# Altium schematic symbol library Блоки трансформаторов импульсных.SCHLIB: 325 symbols (part 1 of 2)
Pins are listed as number, name and electrical type; pins without a type are passive.

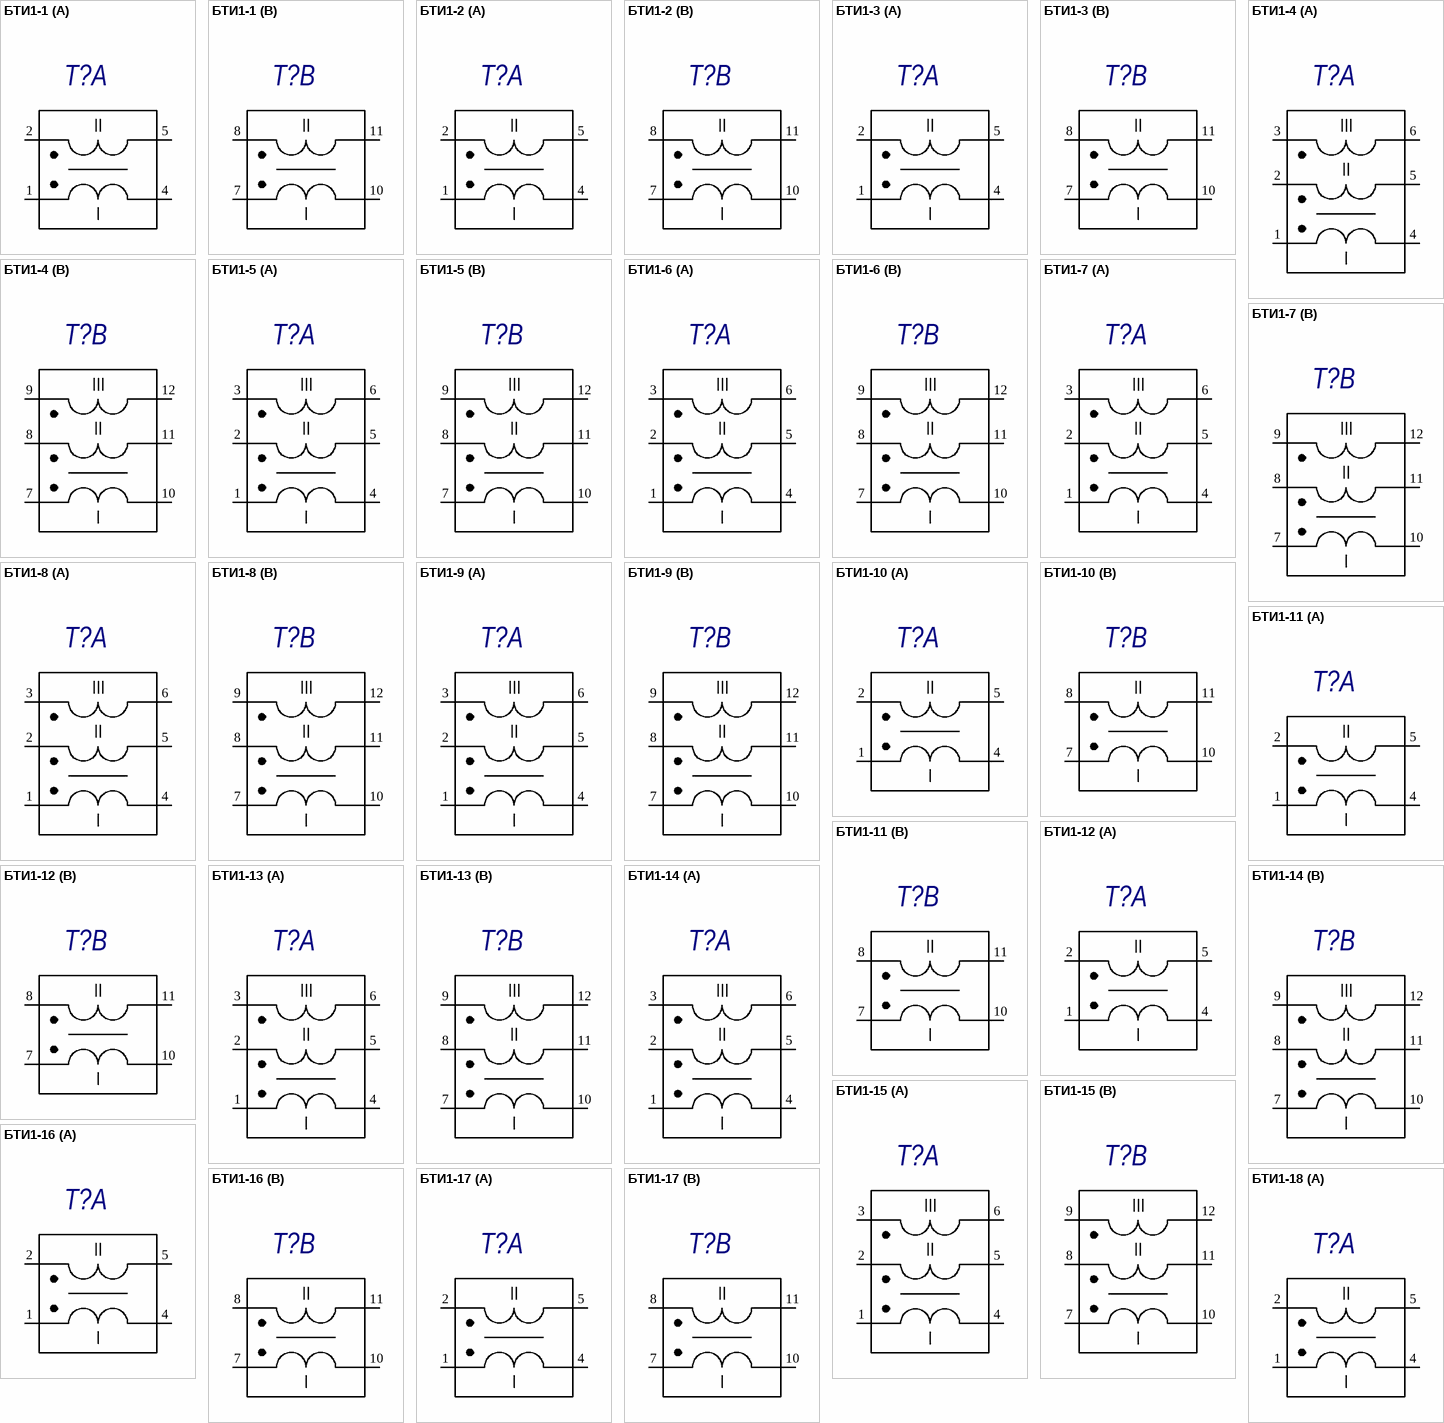
[diagram p0: symbols БТИ1-1 to БТИ1-18]

## БТИ1-1
designator T?
БТИ1; Manufacturer: ПАО  «МСТАТОР»; ManufacturerCountry: Россия; Value: {Value}; Наименование элемента: Дроссель; Category: Трансформатор; ComponentLink1Description: Manufacturer Link
footprint БТИ1
part A pins: 1, 2, 4, 5
part B pins: 7, 8, 10, 11
part A text: II; I
part B text: II; I

## БТИ1-2
designator T?
БТИ1; Manufacturer: ПАО  «МСТАТОР»; ManufacturerCountry: Россия; Value: {Value}; Наименование элемента: Дроссель; Category: Трансформатор; ComponentLink1Description: Manufacturer Link
footprint БТИ1
part A pins: 1, 2, 4, 5
part B pins: 7, 8, 10, 11
part A text: II; I
part B text: II; I

## БТИ1-3
designator T?
БТИ1; Manufacturer: ПАО  «МСТАТОР»; ManufacturerCountry: Россия; Value: {Value}; Наименование элемента: Дроссель; Category: Трансформатор; ComponentLink1Description: Manufacturer Link
footprint БТИ1
part A pins: 1, 2, 4, 5
part B pins: 7, 8, 10, 11
part A text: II; I
part B text: II; I

## БТИ1-4
designator T?
БТИ1; Manufacturer: ПАО  «МСТАТОР»; ManufacturerCountry: Россия; Value: {Value}; Наименование элемента: Дроссель; Category: Трансформатор; ComponentLink1Description: Manufacturer Link
footprint БТИ1
part A pins: 1, 2, 3, 4, 5, 6
part B pins: 7, 8, 9, 10, 11, 12
part A text: III; II; I
part B text: III; II; I

## БТИ1-5
designator T?
БТИ1; Manufacturer: ПАО  «МСТАТОР»; ManufacturerCountry: Россия; Value: {Value}; Наименование элемента: Дроссель; Category: Трансформатор; ComponentLink1Description: Manufacturer Link
footprint БТИ1
part A pins: 1, 2, 3, 4, 5, 6
part B pins: 7, 8, 9, 10, 11, 12
part A text: III; II; I
part B text: III; II; I

## БТИ1-6
designator T?
БТИ1; Manufacturer: ПАО  «МСТАТОР»; ManufacturerCountry: Россия; Value: {Value}; Наименование элемента: Дроссель; Category: Трансформатор; ComponentLink1Description: Manufacturer Link
footprint БТИ1
part A pins: 1, 2, 3, 4, 5, 6
part B pins: 7, 8, 9, 10, 11, 12
part A text: III; II; I
part B text: III; II; I

## БТИ1-7
designator T?
БТИ1; Manufacturer: ПАО  «МСТАТОР»; ManufacturerCountry: Россия; Value: {Value}; Наименование элемента: Дроссель; Category: Трансформатор; ComponentLink1Description: Manufacturer Link
footprint БТИ1
part A pins: 1, 2, 3, 4, 5, 6
part B pins: 7, 8, 9, 10, 11, 12
part A text: III; II; I
part B text: III; II; I

## БТИ1-8
designator T?
БТИ1; Manufacturer: ПАО  «МСТАТОР»; ManufacturerCountry: Россия; Value: {Value}; Наименование элемента: Дроссель; Category: Трансформатор; ComponentLink1Description: Manufacturer Link
footprint БТИ1
part A pins: 1, 2, 3, 4, 5, 6
part B pins: 7, 8, 9, 10, 11, 12
part A text: III; II; I
part B text: III; II; I

## БТИ1-9
designator T?
БТИ1; Manufacturer: ПАО  «МСТАТОР»; ManufacturerCountry: Россия; Value: {Value}; Наименование элемента: Дроссель; Category: Трансформатор; ComponentLink1Description: Manufacturer Link
footprint БТИ1
part A pins: 1, 2, 3, 4, 5, 6
part B pins: 7, 8, 9, 10, 11, 12
part A text: III; II; I
part B text: III; II; I

## БТИ1-10
designator T?
БТИ1; Manufacturer: ПАО  «МСТАТОР»; ManufacturerCountry: Россия; Value: {Value}; Наименование элемента: Дроссель; Category: Трансформатор; ComponentLink1Description: Manufacturer Link
footprint БТИ1
part A pins: 1, 2, 4, 5
part B pins: 7, 8, 10, 11
part A text: II; I
part B text: II; I

## БТИ1-11
designator T?
БТИ1; Manufacturer: ПАО  «МСТАТОР»; ManufacturerCountry: Россия; Value: {Value}; Наименование элемента: Дроссель; Category: Трансформатор; ComponentLink1Description: Manufacturer Link
footprint БТИ1
part A pins: 1, 2, 4, 5
part B pins: 7, 8, 10, 11
part A text: II; I
part B text: II; I

## БТИ1-12
designator T?
БТИ1; Manufacturer: ПАО  «МСТАТОР»; ManufacturerCountry: Россия; Value: {Value}; Наименование элемента: Дроссель; Category: Трансформатор; ComponentLink1Description: Manufacturer Link
footprint БТИ1
part A pins: 1, 2, 4, 5
part B pins: 7, 8, 10, 11
part A text: II; I
part B text: II; I

## БТИ1-13
designator T?
БТИ1; Manufacturer: ПАО  «МСТАТОР»; ManufacturerCountry: Россия; Value: {Value}; Наименование элемента: Дроссель; Category: Трансформатор; ComponentLink1Description: Manufacturer Link
footprint БТИ1
part A pins: 1, 2, 3, 4, 5, 6
part B pins: 7, 8, 9, 10, 11, 12
part A text: III; II; I
part B text: III; II; I

## БТИ1-14
designator T?
БТИ1; Manufacturer: ПАО  «МСТАТОР»; ManufacturerCountry: Россия; Value: {Value}; Наименование элемента: Дроссель; Category: Трансформатор; ComponentLink1Description: Manufacturer Link
footprint БТИ1
part A pins: 1, 2, 3, 4, 5, 6
part B pins: 7, 8, 9, 10, 11, 12
part A text: III; II; I
part B text: III; II; I

## БТИ1-15
designator T?
БТИ1; Manufacturer: ПАО  «МСТАТОР»; ManufacturerCountry: Россия; Value: {Value}; Наименование элемента: Дроссель; Category: Трансформатор; ComponentLink1Description: Manufacturer Link
footprint БТИ1
part A pins: 1, 2, 3, 4, 5, 6
part B pins: 7, 8, 9, 10, 11, 12
part A text: III; II; I
part B text: III; II; I

## БТИ1-16
designator T?
БТИ1; Manufacturer: ПАО  «МСТАТОР»; ManufacturerCountry: Россия; Value: {Value}; Наименование элемента: Дроссель; Category: Трансформатор; ComponentLink1Description: Manufacturer Link
footprint БТИ1
part A pins: 1, 2, 4, 5
part B pins: 7, 8, 10, 11
part A text: II; I
part B text: II; I

## БТИ1-17
designator T?
БТИ1; Manufacturer: ПАО  «МСТАТОР»; ManufacturerCountry: Россия; Value: {Value}; Наименование элемента: Дроссель; Category: Трансформатор; ComponentLink1Description: Manufacturer Link
footprint БТИ1
part A pins: 1, 2, 4, 5
part B pins: 7, 8, 10, 11
part A text: II; I
part B text: II; I

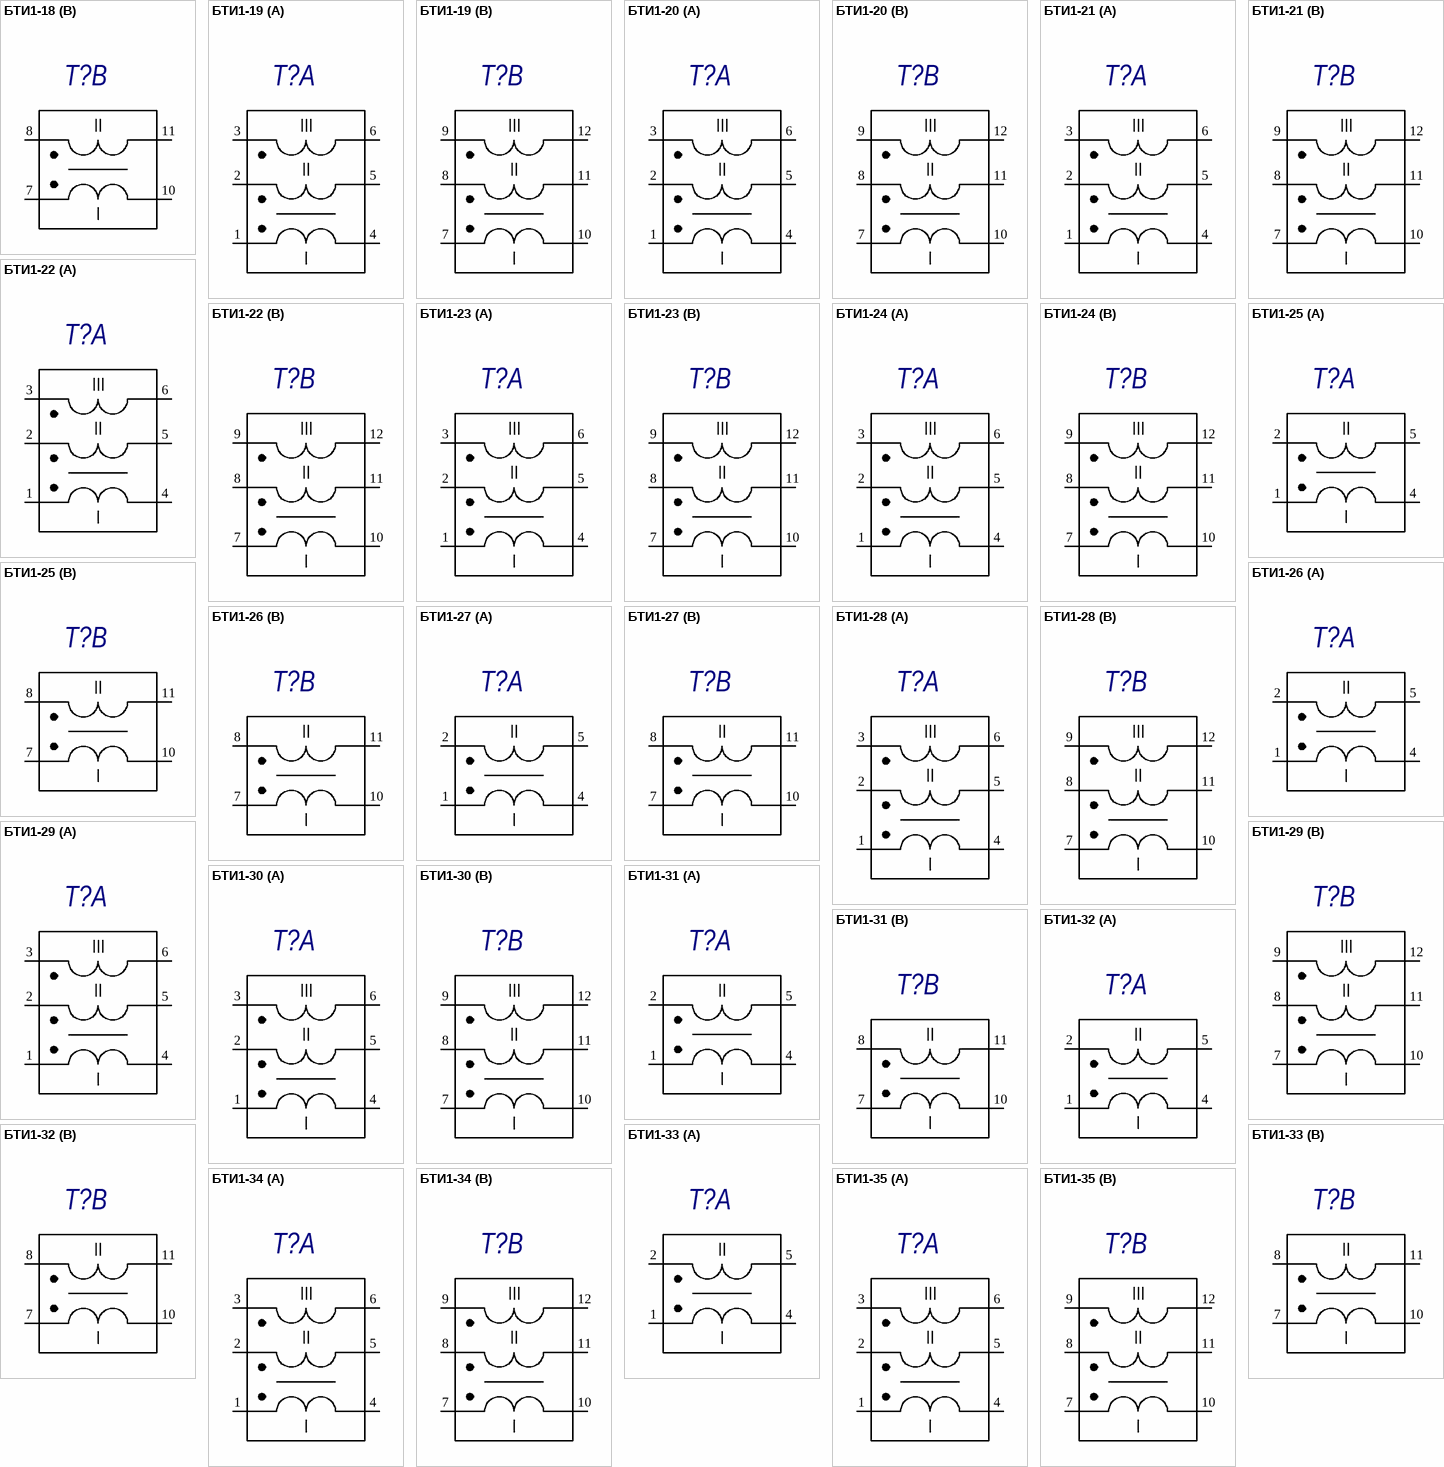
[diagram p1: symbols БТИ1-18 to БТИ1-35]

## БТИ1-18
designator T?
БТИ1; Manufacturer: ПАО  «МСТАТОР»; ManufacturerCountry: Россия; Value: {Value}; Наименование элемента: Дроссель; Category: Трансформатор; ComponentLink1Description: Manufacturer Link
footprint БТИ1
part A pins: 1, 2, 4, 5
part B pins: 7, 8, 10, 11
part A text: II; I
part B text: II; I

## БТИ1-19
designator T?
БТИ1; Manufacturer: ПАО  «МСТАТОР»; ManufacturerCountry: Россия; Value: {Value}; Наименование элемента: Дроссель; Category: Трансформатор; ComponentLink1Description: Manufacturer Link
footprint БТИ1
part A pins: 1, 2, 3, 4, 5, 6
part B pins: 7, 8, 9, 10, 11, 12
part A text: III; II; I
part B text: III; II; I

## БТИ1-20
designator T?
БТИ1; Manufacturer: ПАО  «МСТАТОР»; ManufacturerCountry: Россия; Value: {Value}; Наименование элемента: Дроссель; Category: Трансформатор; ComponentLink1Description: Manufacturer Link
footprint БТИ1
part A pins: 1, 2, 3, 4, 5, 6
part B pins: 7, 8, 9, 10, 11, 12
part A text: III; II; I
part B text: III; II; I

## БТИ1-21
designator T?
БТИ1; Manufacturer: ПАО  «МСТАТОР»; ManufacturerCountry: Россия; Value: {Value}; Наименование элемента: Дроссель; Category: Трансформатор; ComponentLink1Description: Manufacturer Link
footprint БТИ1
part A pins: 1, 2, 3, 4, 5, 6
part B pins: 7, 8, 9, 10, 11, 12
part A text: III; II; I
part B text: III; II; I

## БТИ1-22
designator T?
БТИ1; Manufacturer: ПАО  «МСТАТОР»; ManufacturerCountry: Россия; Value: {Value}; Наименование элемента: Дроссель; Category: Трансформатор; ComponentLink1Description: Manufacturer Link
footprint БТИ1
part A pins: 1, 2, 3, 4, 5, 6
part B pins: 7, 8, 9, 10, 11, 12
part A text: III; II; I
part B text: III; II; I

## БТИ1-23
designator T?
БТИ1; Manufacturer: ПАО  «МСТАТОР»; ManufacturerCountry: Россия; Value: {Value}; Наименование элемента: Дроссель; Category: Трансформатор; ComponentLink1Description: Manufacturer Link
footprint БТИ1
part A pins: 1, 2, 3, 4, 5, 6
part B pins: 7, 8, 9, 10, 11, 12
part A text: III; II; I
part B text: III; II; I

## БТИ1-24
designator T?
БТИ1; Manufacturer: ПАО  «МСТАТОР»; ManufacturerCountry: Россия; Value: {Value}; Наименование элемента: Дроссель; Category: Трансформатор; ComponentLink1Description: Manufacturer Link
footprint БТИ1
part A pins: 1, 2, 3, 4, 5, 6
part B pins: 7, 8, 9, 10, 11, 12
part A text: III; II; I
part B text: III; II; I

## БТИ1-25
designator T?
БТИ1; Manufacturer: ПАО  «МСТАТОР»; ManufacturerCountry: Россия; Value: {Value}; Наименование элемента: Дроссель; Category: Трансформатор; ComponentLink1Description: Manufacturer Link
footprint БТИ1
part A pins: 1, 2, 4, 5
part B pins: 7, 8, 10, 11
part A text: II; I
part B text: II; I

## БТИ1-26
designator T?
БТИ1; Manufacturer: ПАО  «МСТАТОР»; ManufacturerCountry: Россия; Value: {Value}; Наименование элемента: Дроссель; Category: Трансформатор; ComponentLink1Description: Manufacturer Link
footprint БТИ1
part A pins: 1, 2, 4, 5
part B pins: 7, 8, 10, 11
part A text: II; I
part B text: II; I

## БТИ1-27
designator T?
БТИ1; Manufacturer: ПАО  «МСТАТОР»; ManufacturerCountry: Россия; Value: {Value}; Наименование элемента: Дроссель; Category: Трансформатор; ComponentLink1Description: Manufacturer Link
footprint БТИ1
part A pins: 1, 2, 4, 5
part B pins: 7, 8, 10, 11
part A text: II; I
part B text: II; I

## БТИ1-28
designator T?
БТИ1; Manufacturer: ПАО  «МСТАТОР»; ManufacturerCountry: Россия; Value: {Value}; Наименование элемента: Дроссель; Category: Трансформатор; ComponentLink1Description: Manufacturer Link
footprint БТИ1
part A pins: 1, 2, 3, 4, 5, 6
part B pins: 7, 8, 9, 10, 11, 12
part A text: III; II; I
part B text: III; II; I

## БТИ1-29
designator T?
БТИ1; Manufacturer: ПАО  «МСТАТОР»; ManufacturerCountry: Россия; Value: {Value}; Наименование элемента: Дроссель; Category: Трансформатор; ComponentLink1Description: Manufacturer Link
footprint БТИ1
part A pins: 1, 2, 3, 4, 5, 6
part B pins: 7, 8, 9, 10, 11, 12
part A text: III; II; I
part B text: III; II; I

## БТИ1-30
designator T?
БТИ1; Manufacturer: ПАО  «МСТАТОР»; ManufacturerCountry: Россия; Value: {Value}; Наименование элемента: Дроссель; Category: Трансформатор; ComponentLink1Description: Manufacturer Link
footprint БТИ1
part A pins: 1, 2, 3, 4, 5, 6
part B pins: 7, 8, 9, 10, 11, 12
part A text: III; II; I
part B text: III; II; I

## БТИ1-31
designator T?
БТИ1; Manufacturer: ПАО  «МСТАТОР»; ManufacturerCountry: Россия; Value: {Value}; Наименование элемента: Дроссель; Category: Трансформатор; ComponentLink1Description: Manufacturer Link
footprint БТИ1
part A pins: 1, 2, 4, 5
part B pins: 7, 8, 10, 11
part A text: II; I
part B text: II; I

## БТИ1-32
designator T?
БТИ1; Manufacturer: ПАО  «МСТАТОР»; ManufacturerCountry: Россия; Value: {Value}; Наименование элемента: Дроссель; Category: Трансформатор; ComponentLink1Description: Manufacturer Link
footprint БТИ1
part A pins: 1, 2, 4, 5
part B pins: 7, 8, 10, 11
part A text: II; I
part B text: II; I

## БТИ1-33
designator T?
БТИ1; Manufacturer: ПАО  «МСТАТОР»; ManufacturerCountry: Россия; Value: {Value}; Наименование элемента: Дроссель; Category: Трансформатор; ComponentLink1Description: Manufacturer Link
footprint БТИ1
part A pins: 1, 2, 4, 5
part B pins: 7, 8, 10, 11
part A text: II; I
part B text: II; I

## БТИ1-34
designator T?
БТИ1; Manufacturer: ПАО  «МСТАТОР»; ManufacturerCountry: Россия; Value: {Value}; Наименование элемента: Дроссель; Category: Трансформатор; ComponentLink1Description: Manufacturer Link
footprint БТИ1
part A pins: 1, 2, 3, 4, 5, 6
part B pins: 7, 8, 9, 10, 11, 12
part A text: III; II; I
part B text: III; II; I

## БТИ1-35
designator T?
БТИ1; Manufacturer: ПАО  «МСТАТОР»; ManufacturerCountry: Россия; Value: {Value}; Наименование элемента: Дроссель; Category: Трансформатор; ComponentLink1Description: Manufacturer Link
footprint БТИ1
part A pins: 1, 2, 3, 4, 5, 6
part B pins: 7, 8, 9, 10, 11, 12
part A text: III; II; I
part B text: III; II; I

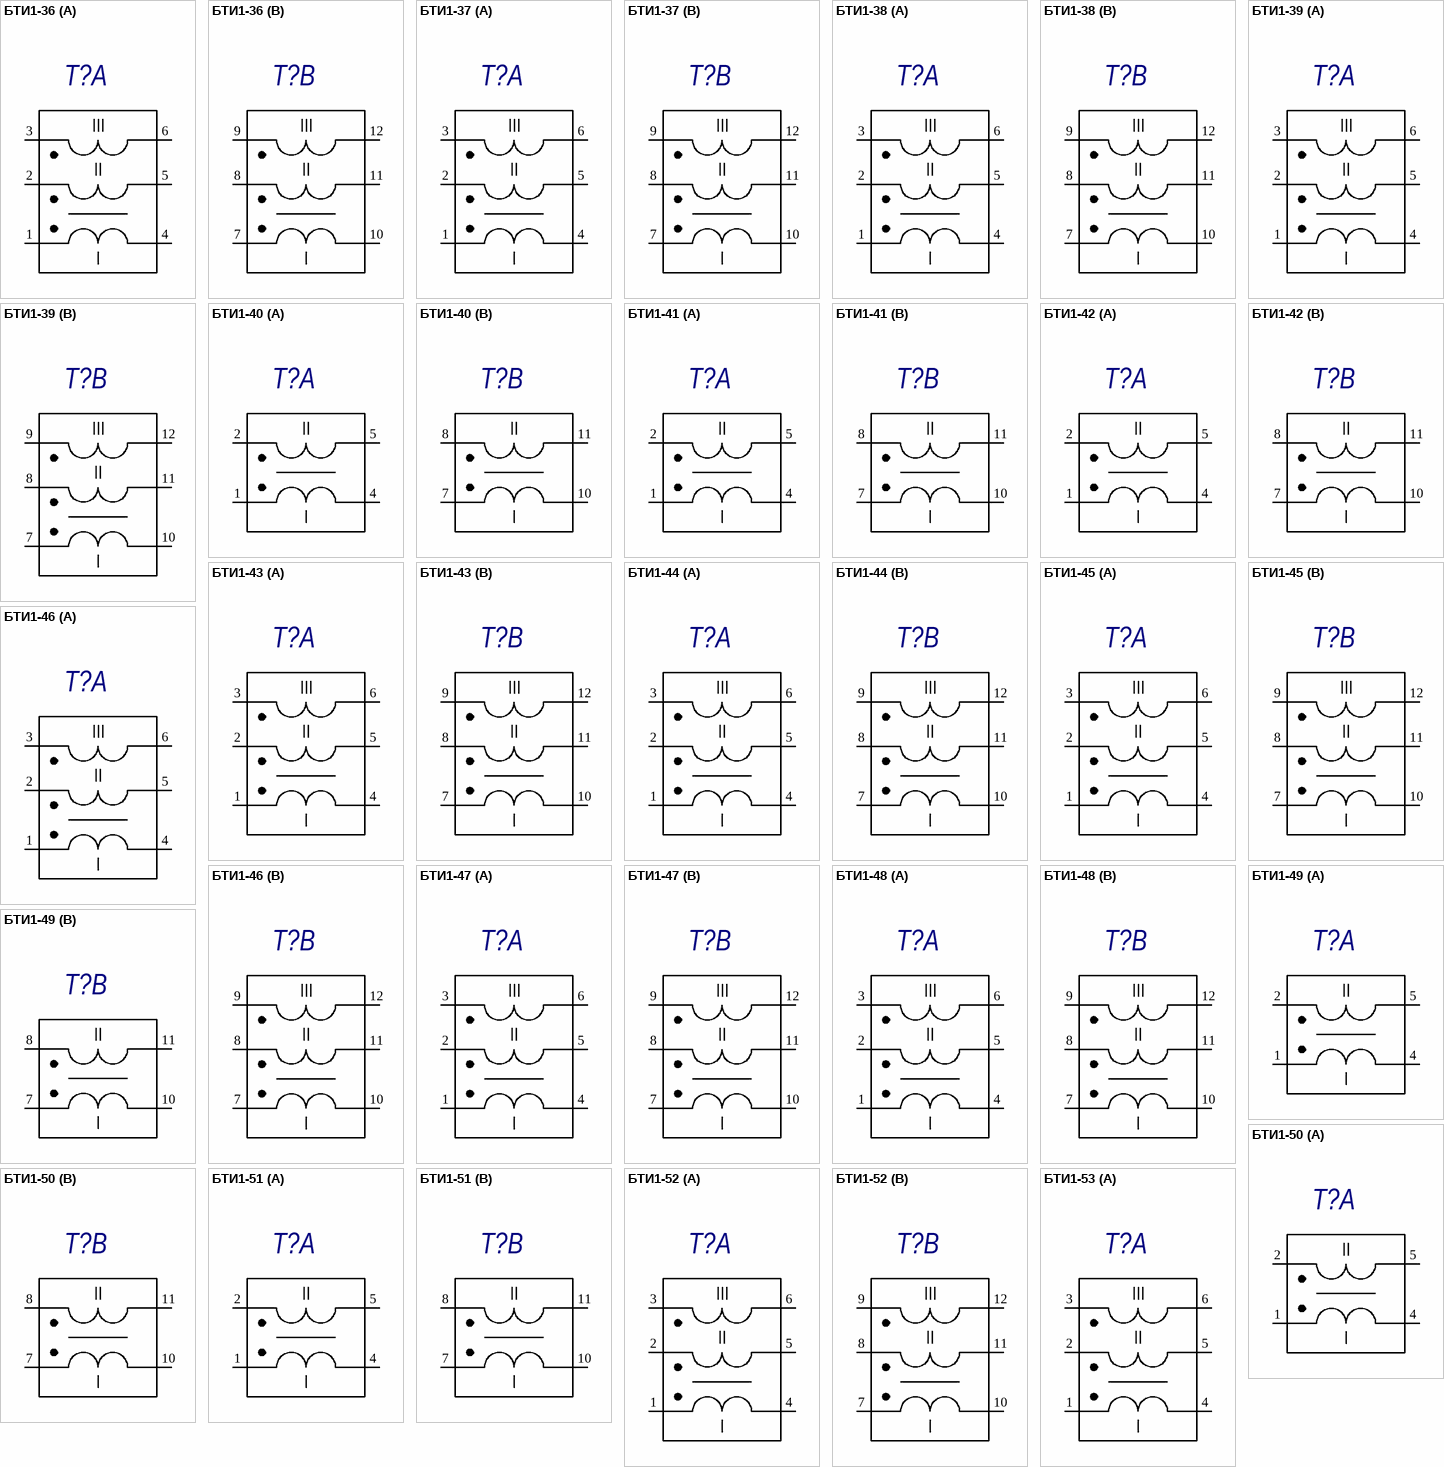
[diagram p2: symbols БТИ1-36 to БТИ1-53]

## БТИ1-36
designator T?
БТИ1; Manufacturer: ПАО  «МСТАТОР»; ManufacturerCountry: Россия; Value: {Value}; Наименование элемента: Дроссель; Category: Трансформатор; ComponentLink1Description: Manufacturer Link
footprint БТИ1
part A pins: 1, 2, 3, 4, 5, 6
part B pins: 7, 8, 9, 10, 11, 12
part A text: III; II; I
part B text: III; II; I

## БТИ1-37
designator T?
БТИ1; Manufacturer: ПАО  «МСТАТОР»; ManufacturerCountry: Россия; Value: {Value}; Наименование элемента: Дроссель; Category: Трансформатор; ComponentLink1Description: Manufacturer Link
footprint БТИ1
part A pins: 1, 2, 3, 4, 5, 6
part B pins: 7, 8, 9, 10, 11, 12
part A text: III; II; I
part B text: III; II; I

## БТИ1-38
designator T?
БТИ1; Manufacturer: ПАО  «МСТАТОР»; ManufacturerCountry: Россия; Value: {Value}; Наименование элемента: Дроссель; Category: Трансформатор; ComponentLink1Description: Manufacturer Link
footprint БТИ1
part A pins: 1, 2, 3, 4, 5, 6
part B pins: 7, 8, 9, 10, 11, 12
part A text: III; II; I
part B text: III; II; I

## БТИ1-39
designator T?
БТИ1; Manufacturer: ПАО  «МСТАТОР»; ManufacturerCountry: Россия; Value: {Value}; Наименование элемента: Дроссель; Category: Трансформатор; ComponentLink1Description: Manufacturer Link
footprint БТИ1
part A pins: 1, 2, 3, 4, 5, 6
part B pins: 7, 8, 9, 10, 11, 12
part A text: III; II; I
part B text: III; II; I

## БТИ1-40
designator T?
БТИ1; Manufacturer: ПАО  «МСТАТОР»; ManufacturerCountry: Россия; Value: {Value}; Наименование элемента: Дроссель; Category: Трансформатор; ComponentLink1Description: Manufacturer Link
footprint БТИ1
part A pins: 1, 2, 4, 5
part B pins: 7, 8, 10, 11
part A text: II; I
part B text: II; I

## БТИ1-41
designator T?
БТИ1; Manufacturer: ПАО  «МСТАТОР»; ManufacturerCountry: Россия; Value: {Value}; Наименование элемента: Дроссель; Category: Трансформатор; ComponentLink1Description: Manufacturer Link
footprint БТИ1
part A pins: 1, 2, 4, 5
part B pins: 7, 8, 10, 11
part A text: II; I
part B text: II; I

## БТИ1-42
designator T?
БТИ1; Manufacturer: ПАО  «МСТАТОР»; ManufacturerCountry: Россия; Value: {Value}; Наименование элемента: Дроссель; Category: Трансформатор; ComponentLink1Description: Manufacturer Link
footprint БТИ1
part A pins: 1, 2, 4, 5
part B pins: 7, 8, 10, 11
part A text: II; I
part B text: II; I

## БТИ1-43
designator T?
БТИ1; Manufacturer: ПАО  «МСТАТОР»; ManufacturerCountry: Россия; Value: {Value}; Наименование элемента: Дроссель; Category: Трансформатор; ComponentLink1Description: Manufacturer Link
footprint БТИ1
part A pins: 1, 2, 3, 4, 5, 6
part B pins: 7, 8, 9, 10, 11, 12
part A text: III; II; I
part B text: III; II; I

## БТИ1-44
designator T?
БТИ1; Manufacturer: ПАО  «МСТАТОР»; ManufacturerCountry: Россия; Value: {Value}; Наименование элемента: Дроссель; Category: Трансформатор; ComponentLink1Description: Manufacturer Link
footprint БТИ1
part A pins: 1, 2, 3, 4, 5, 6
part B pins: 7, 8, 9, 10, 11, 12
part A text: III; II; I
part B text: III; II; I

## БТИ1-45
designator T?
БТИ1; Manufacturer: ПАО  «МСТАТОР»; ManufacturerCountry: Россия; Value: {Value}; Наименование элемента: Дроссель; Category: Трансформатор; ComponentLink1Description: Manufacturer Link
footprint БТИ1
part A pins: 1, 2, 3, 4, 5, 6
part B pins: 7, 8, 9, 10, 11, 12
part A text: III; II; I
part B text: III; II; I

## БТИ1-46
designator T?
БТИ1; Manufacturer: ПАО  «МСТАТОР»; ManufacturerCountry: Россия; Value: {Value}; Наименование элемента: Дроссель; Category: Трансформатор; ComponentLink1Description: Manufacturer Link
footprint БТИ1
part A pins: 1, 2, 3, 4, 5, 6
part B pins: 7, 8, 9, 10, 11, 12
part A text: III; II; I
part B text: III; II; I

## БТИ1-47
designator T?
БТИ1; Manufacturer: ПАО  «МСТАТОР»; ManufacturerCountry: Россия; Value: {Value}; Наименование элемента: Дроссель; Category: Трансформатор; ComponentLink1Description: Manufacturer Link
footprint БТИ1
part A pins: 1, 2, 3, 4, 5, 6
part B pins: 7, 8, 9, 10, 11, 12
part A text: III; II; I
part B text: III; II; I

## БТИ1-48
designator T?
БТИ1; Manufacturer: ПАО  «МСТАТОР»; ManufacturerCountry: Россия; Value: {Value}; Наименование элемента: Дроссель; Category: Трансформатор; ComponentLink1Description: Manufacturer Link
footprint БТИ1
part A pins: 1, 2, 3, 4, 5, 6
part B pins: 7, 8, 9, 10, 11, 12
part A text: III; II; I
part B text: III; II; I

## БТИ1-49
designator T?
БТИ1; Manufacturer: ПАО  «МСТАТОР»; ManufacturerCountry: Россия; Value: {Value}; Наименование элемента: Дроссель; Category: Трансформатор; ComponentLink1Description: Manufacturer Link
footprint БТИ1
part A pins: 1, 2, 4, 5
part B pins: 7, 8, 10, 11
part A text: II; I
part B text: II; I

## БТИ1-50
designator T?
БТИ1; Manufacturer: ПАО  «МСТАТОР»; ManufacturerCountry: Россия; Value: {Value}; Наименование элемента: Дроссель; Category: Трансформатор; ComponentLink1Description: Manufacturer Link
footprint БТИ1
part A pins: 1, 2, 4, 5
part B pins: 7, 8, 10, 11
part A text: II; I
part B text: II; I

## БТИ1-51
designator T?
БТИ1; Manufacturer: ПАО  «МСТАТОР»; ManufacturerCountry: Россия; Value: {Value}; Наименование элемента: Дроссель; Category: Трансформатор; ComponentLink1Description: Manufacturer Link
footprint БТИ1
part A pins: 1, 2, 4, 5
part B pins: 7, 8, 10, 11
part A text: II; I
part B text: II; I

## БТИ1-52
designator T?
БТИ1; Manufacturer: ПАО  «МСТАТОР»; ManufacturerCountry: Россия; Value: {Value}; Наименование элемента: Дроссель; Category: Трансформатор; ComponentLink1Description: Manufacturer Link
footprint БТИ1
part A pins: 1, 2, 3, 4, 5, 6
part B pins: 7, 8, 9, 10, 11, 12
part A text: III; II; I
part B text: III; II; I

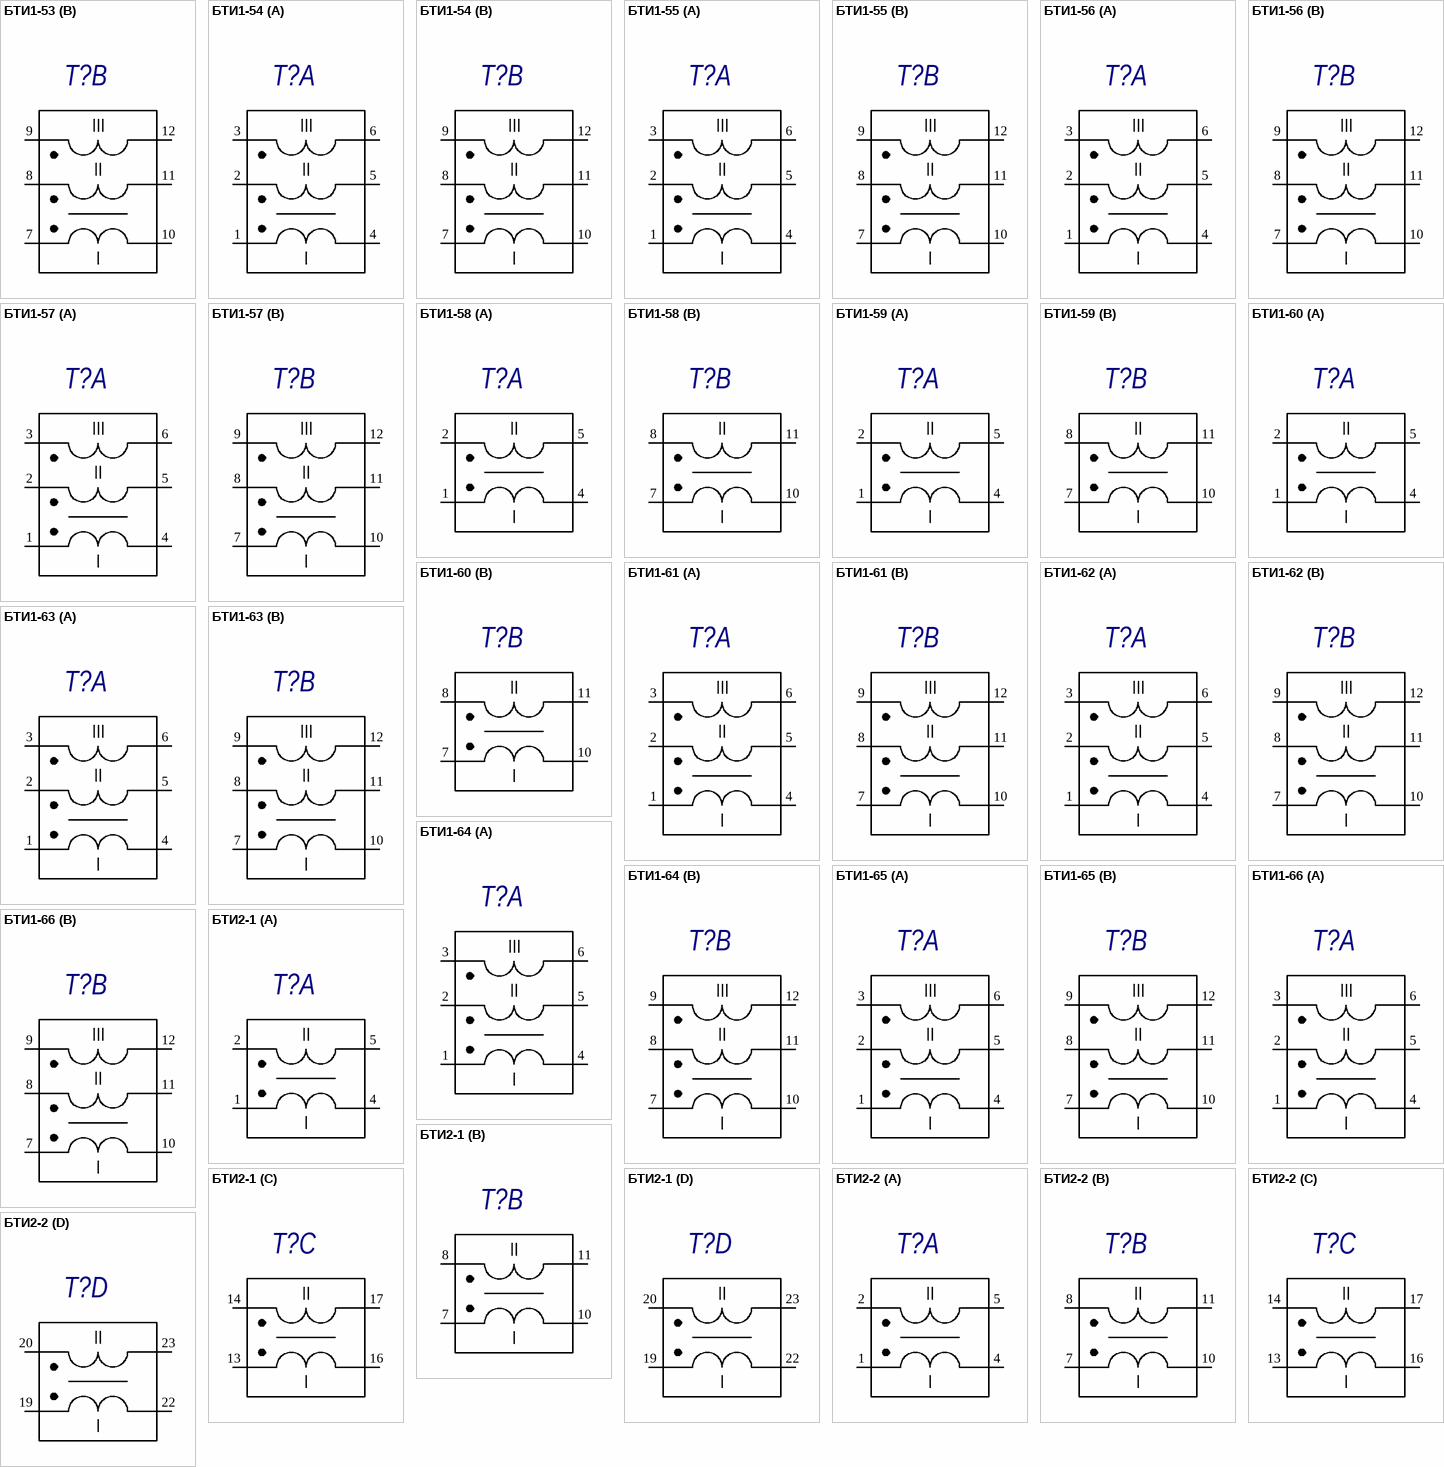
[diagram p3: symbols БТИ1-53 to БТИ2-2]

## БТИ1-53
designator T?
БТИ1; Manufacturer: ПАО  «МСТАТОР»; ManufacturerCountry: Россия; Value: {Value}; Наименование элемента: Дроссель; Category: Трансформатор; ComponentLink1Description: Manufacturer Link
footprint БТИ1
part A pins: 1, 2, 3, 4, 5, 6
part B pins: 7, 8, 9, 10, 11, 12
part A text: III; II; I
part B text: III; II; I

## БТИ1-54
designator T?
БТИ1; Manufacturer: ПАО  «МСТАТОР»; ManufacturerCountry: Россия; Value: {Value}; Наименование элемента: Дроссель; Category: Трансформатор; ComponentLink1Description: Manufacturer Link
footprint БТИ1
part A pins: 1, 2, 3, 4, 5, 6
part B pins: 7, 8, 9, 10, 11, 12
part A text: III; II; I
part B text: III; II; I

## БТИ1-55
designator T?
БТИ1; Manufacturer: ПАО  «МСТАТОР»; ManufacturerCountry: Россия; Value: {Value}; Наименование элемента: Дроссель; Category: Трансформатор; ComponentLink1Description: Manufacturer Link
footprint БТИ1
part A pins: 1, 2, 3, 4, 5, 6
part B pins: 7, 8, 9, 10, 11, 12
part A text: III; II; I
part B text: III; II; I

## БТИ1-56
designator T?
БТИ1; Manufacturer: ПАО  «МСТАТОР»; ManufacturerCountry: Россия; Value: {Value}; Наименование элемента: Дроссель; Category: Трансформатор; ComponentLink1Description: Manufacturer Link
footprint БТИ1
part A pins: 1, 2, 3, 4, 5, 6
part B pins: 7, 8, 9, 10, 11, 12
part A text: III; II; I
part B text: III; II; I

## БТИ1-57
designator T?
БТИ1; Manufacturer: ПАО  «МСТАТОР»; ManufacturerCountry: Россия; Value: {Value}; Наименование элемента: Дроссель; Category: Трансформатор; ComponentLink1Description: Manufacturer Link
footprint БТИ1
part A pins: 1, 2, 3, 4, 5, 6
part B pins: 7, 8, 9, 10, 11, 12
part A text: III; II; I
part B text: III; II; I

## БТИ1-58
designator T?
БТИ1; Manufacturer: ПАО  «МСТАТОР»; ManufacturerCountry: Россия; Value: {Value}; Наименование элемента: Дроссель; Category: Трансформатор; ComponentLink1Description: Manufacturer Link
footprint БТИ1
part A pins: 1, 2, 4, 5
part B pins: 7, 8, 10, 11
part A text: II; I
part B text: II; I

## БТИ1-59
designator T?
БТИ1; Manufacturer: ПАО  «МСТАТОР»; ManufacturerCountry: Россия; Value: {Value}; Наименование элемента: Дроссель; Category: Трансформатор; ComponentLink1Description: Manufacturer Link
footprint БТИ1
part A pins: 1, 2, 4, 5
part B pins: 7, 8, 10, 11
part A text: II; I
part B text: II; I

## БТИ1-60
designator T?
БТИ1; Manufacturer: ПАО  «МСТАТОР»; ManufacturerCountry: Россия; Value: {Value}; Наименование элемента: Дроссель; Category: Трансформатор; ComponentLink1Description: Manufacturer Link
footprint БТИ1
part A pins: 1, 2, 4, 5
part B pins: 7, 8, 10, 11
part A text: II; I
part B text: II; I

## БТИ1-61
designator T?
БТИ1; Manufacturer: ПАО  «МСТАТОР»; ManufacturerCountry: Россия; Value: {Value}; Наименование элемента: Дроссель; Category: Трансформатор; ComponentLink1Description: Manufacturer Link
footprint БТИ1
part A pins: 1, 2, 3, 4, 5, 6
part B pins: 7, 8, 9, 10, 11, 12
part A text: III; II; I
part B text: III; II; I

## БТИ1-62
designator T?
БТИ1; Manufacturer: ПАО  «МСТАТОР»; ManufacturerCountry: Россия; Value: {Value}; Наименование элемента: Дроссель; Category: Трансформатор; ComponentLink1Description: Manufacturer Link
footprint БТИ1
part A pins: 1, 2, 3, 4, 5, 6
part B pins: 7, 8, 9, 10, 11, 12
part A text: III; II; I
part B text: III; II; I

## БТИ1-63
designator T?
БТИ1; Manufacturer: ПАО  «МСТАТОР»; ManufacturerCountry: Россия; Value: {Value}; Наименование элемента: Дроссель; Category: Трансформатор; ComponentLink1Description: Manufacturer Link
footprint БТИ1
part A pins: 1, 2, 3, 4, 5, 6
part B pins: 7, 8, 9, 10, 11, 12
part A text: III; II; I
part B text: III; II; I

## БТИ1-64
designator T?
БТИ1; Manufacturer: ПАО  «МСТАТОР»; ManufacturerCountry: Россия; Value: {Value}; Наименование элемента: Дроссель; Category: Трансформатор; ComponentLink1Description: Manufacturer Link
footprint БТИ1
part A pins: 1, 2, 3, 4, 5, 6
part B pins: 7, 8, 9, 10, 11, 12
part A text: III; II; I
part B text: III; II; I

## БТИ1-65
designator T?
БТИ1; Manufacturer: ПАО  «МСТАТОР»; ManufacturerCountry: Россия; Value: {Value}; Наименование элемента: Дроссель; Category: Трансформатор; ComponentLink1Description: Manufacturer Link
footprint БТИ1
part A pins: 1, 2, 3, 4, 5, 6
part B pins: 7, 8, 9, 10, 11, 12
part A text: III; II; I
part B text: III; II; I

## БТИ1-66
designator T?
БТИ1; Manufacturer: ПАО  «МСТАТОР»; ManufacturerCountry: Россия; Value: {Value}; Наименование элемента: Дроссель; Category: Трансформатор; ComponentLink1Description: Manufacturer Link
footprint БТИ1
part A pins: 1, 2, 3, 4, 5, 6
part B pins: 7, 8, 9, 10, 11, 12
part A text: III; II; I
part B text: III; II; I

## БТИ2-1
designator T?
БТИ2; Manufacturer: ПАО  «МСТАТОР»; ManufacturerCountry: Россия; Value: {Value}; Наименование элемента: Дроссель; Category: Трансформатор; ComponentLink1Description: Manufacturer Link
footprint БТИ2
part A pins: 1, 2, 4, 5
part B pins: 7, 8, 10, 11
part C pins: 13, 14, 16, 17
part D pins: 19, 20, 22, 23
part A text: II; I
part B text: II; I
part C text: II; I
part D text: II; I

## БТИ2-2
designator T?
БТИ2; Manufacturer: ПАО  «МСТАТОР»; ManufacturerCountry: Россия; Value: {Value}; Наименование элемента: Дроссель; Category: Трансформатор; ComponentLink1Description: Manufacturer Link
footprint БТИ2
part A pins: 1, 2, 4, 5
part B pins: 7, 8, 10, 11
part C pins: 13, 14, 16, 17
part D pins: 19, 20, 22, 23
part A text: II; I
part B text: II; I
part C text: II; I
part D text: II; I

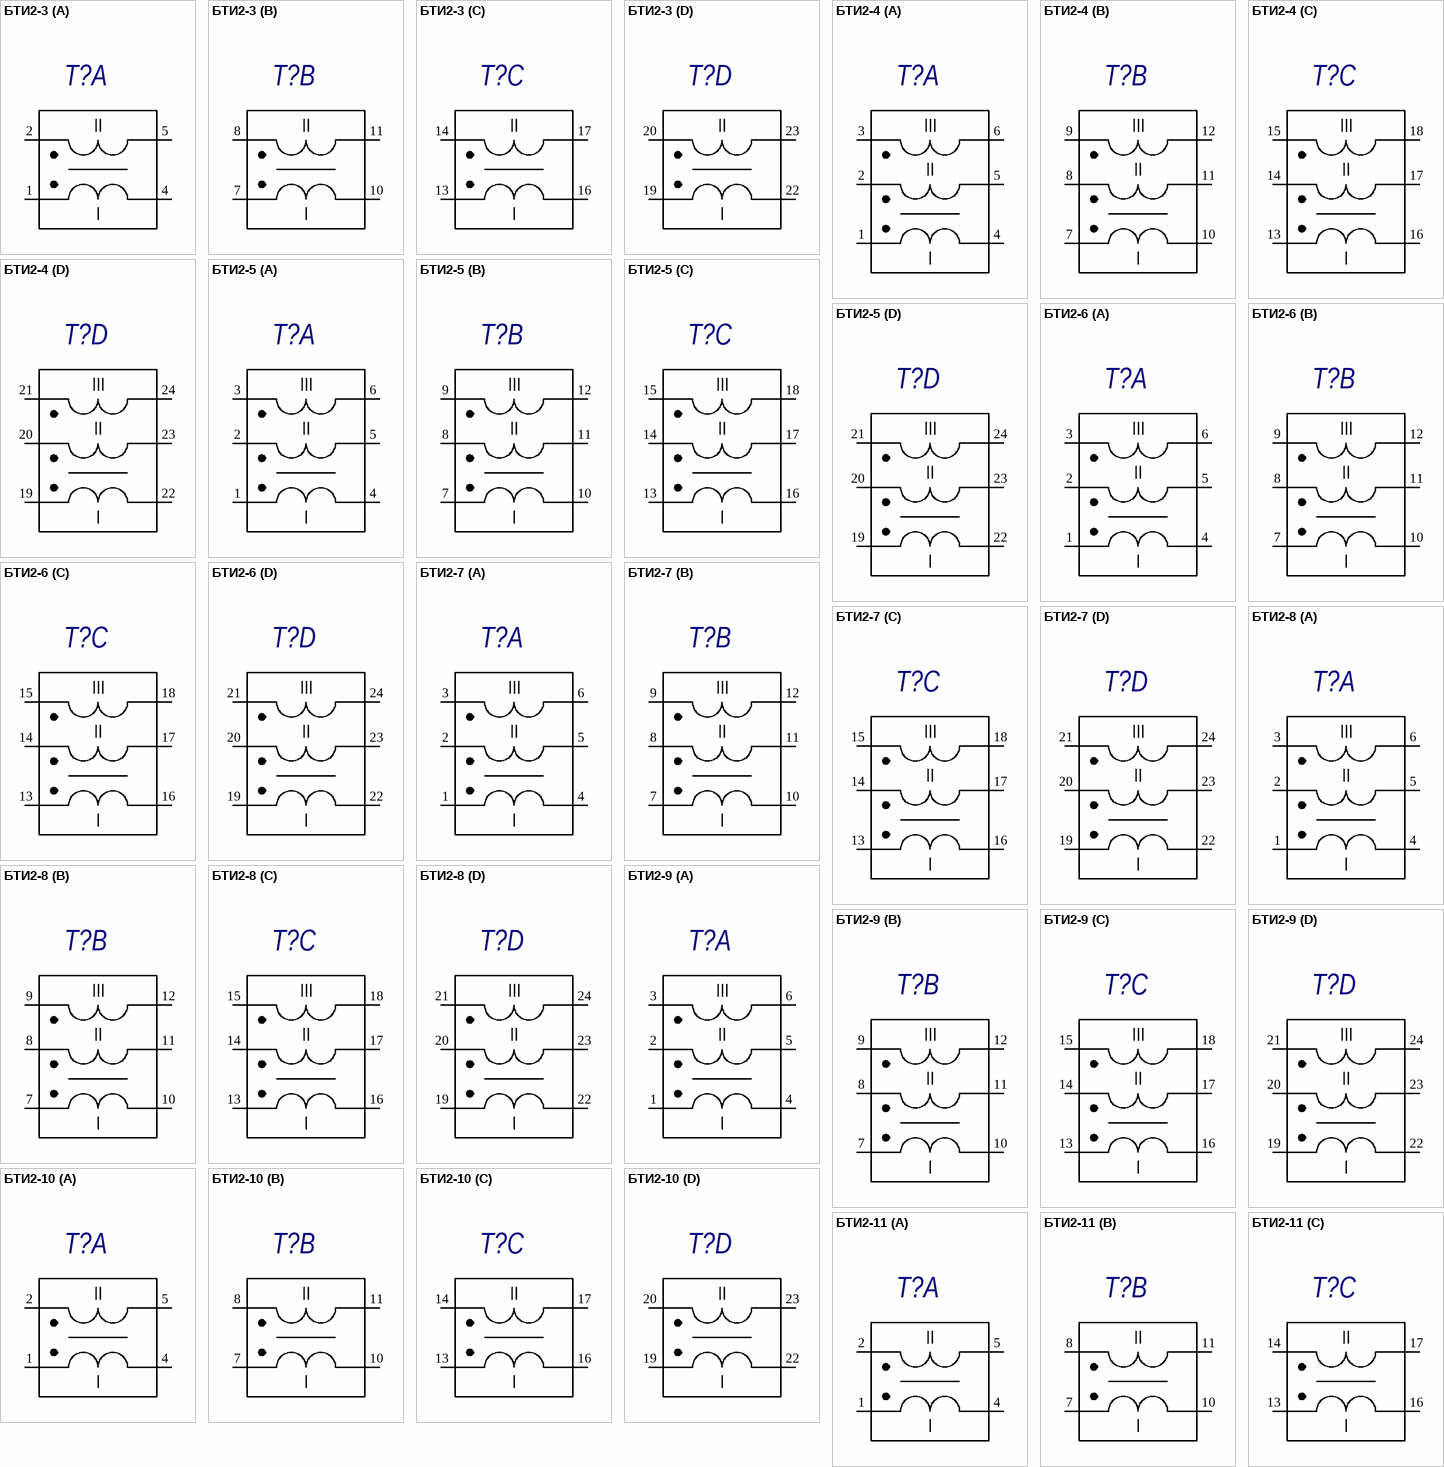
[diagram p4: symbols БТИ2-3 to БТИ2-11]

## БТИ2-3
designator T?
БТИ2; Manufacturer: ПАО  «МСТАТОР»; ManufacturerCountry: Россия; Value: {Value}; Наименование элемента: Дроссель; Category: Трансформатор; ComponentLink1Description: Manufacturer Link
footprint БТИ2
part A pins: 1, 2, 4, 5
part B pins: 7, 8, 10, 11
part C pins: 13, 14, 16, 17
part D pins: 19, 20, 22, 23
part A text: II; I
part B text: II; I
part C text: II; I
part D text: II; I

## БТИ2-4
designator T?
БТИ2; Manufacturer: ПАО  «МСТАТОР»; ManufacturerCountry: Россия; Value: {Value}; Наименование элемента: Дроссель; Category: Трансформатор; ComponentLink1Description: Manufacturer Link
footprint БТИ2
part A pins: 1, 2, 3, 4, 5, 6
part B pins: 7, 8, 9, 10, 11, 12
part C pins: 13, 14, 15, 16, 17, 18
part D pins: 19, 20, 21, 22, 23, 24
part A text: III; II; I
part B text: III; II; I
part C text: III; II; I
part D text: III; II; I

## БТИ2-5
designator T?
БТИ2; Manufacturer: ПАО  «МСТАТОР»; ManufacturerCountry: Россия; Value: {Value}; Наименование элемента: Дроссель; Category: Трансформатор; ComponentLink1Description: Manufacturer Link
footprint БТИ2
part A pins: 1, 2, 3, 4, 5, 6
part B pins: 7, 8, 9, 10, 11, 12
part C pins: 13, 14, 15, 16, 17, 18
part D pins: 19, 20, 21, 22, 23, 24
part A text: III; II; I
part B text: III; II; I
part C text: III; II; I
part D text: III; II; I

## БТИ2-6
designator T?
БТИ2; Manufacturer: ПАО  «МСТАТОР»; ManufacturerCountry: Россия; Value: {Value}; Наименование элемента: Дроссель; Category: Трансформатор; ComponentLink1Description: Manufacturer Link
footprint БТИ2
part A pins: 1, 2, 3, 4, 5, 6
part B pins: 7, 8, 9, 10, 11, 12
part C pins: 13, 14, 15, 16, 17, 18
part D pins: 19, 20, 21, 22, 23, 24
part A text: III; II; I
part B text: III; II; I
part C text: III; II; I
part D text: III; II; I

## БТИ2-7
designator T?
БТИ2; Manufacturer: ПАО  «МСТАТОР»; ManufacturerCountry: Россия; Value: {Value}; Наименование элемента: Дроссель; Category: Трансформатор; ComponentLink1Description: Manufacturer Link
footprint БТИ2
part A pins: 1, 2, 3, 4, 5, 6
part B pins: 7, 8, 9, 10, 11, 12
part C pins: 13, 14, 15, 16, 17, 18
part D pins: 19, 20, 21, 22, 23, 24
part A text: III; II; I
part B text: III; II; I
part C text: III; II; I
part D text: III; II; I

## БТИ2-8
designator T?
БТИ2; Manufacturer: ПАО  «МСТАТОР»; ManufacturerCountry: Россия; Value: {Value}; Наименование элемента: Дроссель; Category: Трансформатор; ComponentLink1Description: Manufacturer Link
footprint БТИ2
part A pins: 1, 2, 3, 4, 5, 6
part B pins: 7, 8, 9, 10, 11, 12
part C pins: 13, 14, 15, 16, 17, 18
part D pins: 19, 20, 21, 22, 23, 24
part A text: III; II; I
part B text: III; II; I
part C text: III; II; I
part D text: III; II; I

## БТИ2-9
designator T?
БТИ2; Manufacturer: ПАО  «МСТАТОР»; ManufacturerCountry: Россия; Value: {Value}; Наименование элемента: Дроссель; Category: Трансформатор; ComponentLink1Description: Manufacturer Link
footprint БТИ2
part A pins: 1, 2, 3, 4, 5, 6
part B pins: 7, 8, 9, 10, 11, 12
part C pins: 13, 14, 15, 16, 17, 18
part D pins: 19, 20, 21, 22, 23, 24
part A text: III; II; I
part B text: III; II; I
part C text: III; II; I
part D text: III; II; I

## БТИ2-10
designator T?
БТИ2; Manufacturer: ПАО  «МСТАТОР»; ManufacturerCountry: Россия; Value: {Value}; Наименование элемента: Дроссель; Category: Трансформатор; ComponentLink1Description: Manufacturer Link
footprint БТИ2
part A pins: 1, 2, 4, 5
part B pins: 7, 8, 10, 11
part C pins: 13, 14, 16, 17
part D pins: 19, 20, 22, 23
